# Altium footprint library LUMI_Handy_Soldering_LIB.PcbLib: 562 footprints (part 21 of 36)
Each footprint in its own frame and in the unit in brackets; x right, y up, seen from the top. Pads: shape width x height; smd on the part's side, far side on the other; paste and mask are expansions set on the pad; w line width, h text height; cw(c..) or ccw(c..) is an arc to the next point about the centre after c.
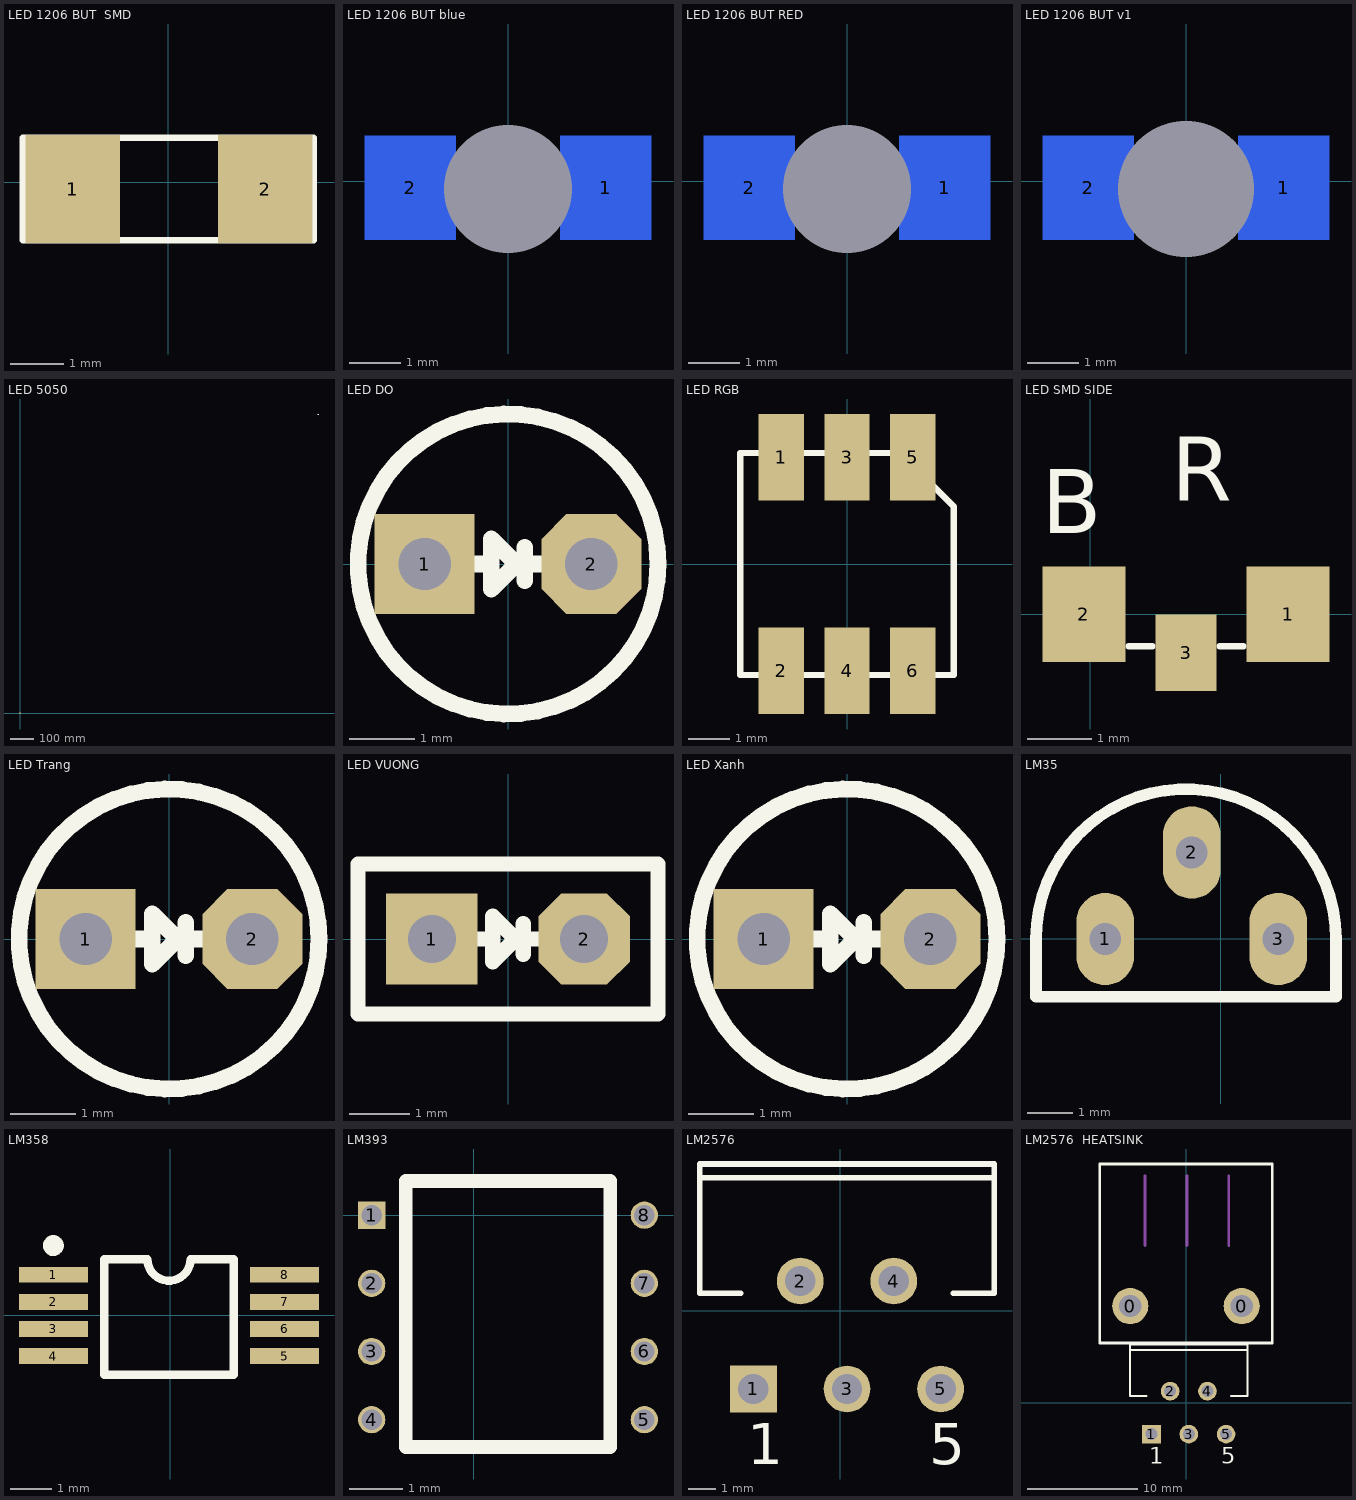
[diagram p20: the footprints below, top view; thin cyan lines are the x and y axes]

## LED 1206 BUT  SMD [mil]
pads (2):
  rect 70x80 smd: 1(-71,-5) 2(72,-5)
Top Overlay:
  lines w5: -108,-43 108,-43 108,33 -108,33 -108,-43
3D body: height 43.81, standoff -15.9, extent -60,-37 66,26

## LED 1206 BUT blue [mil]
pads (3):
  rect 70x80 smd far side: 1(75,-5) 2(-75,-5)
  round 0 hole 98.43: ""(0,-6)
Bottom Overlay:
  lines w5: -110,-43 110,-43 110,33 -110,33 -110,-43
3D body: height 6.31, standoff -37, extent -63.39,-37.5 63.39,25.5

## LED 1206 BUT RED [mil]
pads (3):
  rect 70x80 smd far side: 1(75,-5) 2(-75,-5)
  round 0 hole 98.43: ""(0,-6)
Bottom Overlay:
  lines w5: -110,-43 -110,33 110,33 110,-43 -110,-43
3D body: height 6.31, standoff -37, extent -63.39,-37.5 63.39,25.5

## LED 1206 BUT v1 [mil]
pads (3):
  rect 70x80 smd far side: 1(75,-5) 2(-75,-5)
  round 98.43 hole 104.33: ""(0,-6)
Bottom Overlay:
  lines w5: -110,-43 110,-43 110,33 -110,33 -110,-43
3D body: height 8.81, standoff -50.9, extent -63,-37 63,26

## LED 5050 [mm]
pads (8):
  rect 2.5x1 smd: 1(-2.286,1.27) 2(-2.286,-0.254) 3(-2.286,-1.778) 4(2.55,-1.782) 5(2.55,-0.258) 6(2.55,1.266)
  rect 1.778x2.032 smd: 1(1264.197,1269.873) 2(1267.829,1269.873)
Top Overlay:
  lines w0.127: 1263.257,1268.908 1268.743,1268.908 1268.743,1270.838 1263.257,1270.838 1263.257,1268.908
3D body: height 1.6, standoff 0, extent -2.55,-2.75 2.75,2.25
3D body: height 1.11, standoff -0.4, extent 1264.476,1269.06 1267.676,1270.66

## LED DO [mil]
pads (2):
  rect 60x60 hole 31.5: 1(-50,0)
  oct 60x60 hole 31.5: 2(50,0)
Top Overlay:
  circle w10: c0,0 r90
  lines w10: -20,0 -10,0 ; 10,-10 10,10 ; 10,0 20,0 ; -10,-15 -10,15 5,0 -10,-15
3D body: height 212, standoff -125, extent -78.42,-58.99 78.43,78.51

## LED RGB [mm] "Typical GAs Led, through hole, pitch 100mil"
pads (6):
  rect 1.1x2.1 smd: 1(-1.6,2.6) 2(-1.6,-2.6) 3(0,2.6) 4(0,-2.6) 5(1.6,2.6) 6(1.6,-2.6)
Top Overlay:
  lines w0.152: -2.6,-2.7 -2.6,2.7 1.3,2.7 2.6,1.4 2.6,-2.7 -2.6,-2.7
3D body: height 1.5, standoff -0.1, extent -2.5,-2.6 2.5,2.6

## LED SMD SIDE [mm]
pads (3):
  rect 1.3x1.5 smd: 1(3.1,0) 2(-0.1,0)
  rect 0.95x1.2 smd: 3(1.5,-0.6)
Top Overlay:
  lines w0.1: 0.6,-0.5 0.975,-0.5 ; 2.025,-0.5 2.4,-0.5
  text "B" at -0.762,1.27 h1
  text "R" at 1.27,1.778 h1
3D body: height 1, standoff 0, extent 0,-0.45 3,1.55

## LED Trang [mil]
pads (2):
  rect 60x60 hole 31.5: 1(-50,0)
  oct 60x60 hole 31.5: 2(50,0)
Top Overlay:
  circle w10: c0,0 r90
  lines w10: -20,0 -10,0 ; 10,-10 10,10 ; 10,0 20,0 ; -10,-15 -10,15 5,0 -10,-15
3D body: height 255.91, standoff -78.74, extent -74.8,-74.8 63,74.8

## LED VUONG [mil]
pads (2):
  rect 60x60 hole 31.5: 1(-50,0)
  oct 60x60 hole 31.5: 2(50,0)
Top Overlay:
  lines w10: -20,0 -10,0 ; 10,-10 10,10 ; 10,0 20,0 ; -98.43,-49.21 -98.43,49.21 98.43,49.21 98.43,-49.21 -98.43,-49.21 ; -10,-15 -10,15 5,0 -10,-15

## LED Xanh [mil]
pads (2):
  rect 60x60 hole 31.5: 1(-50,0)
  oct 60x60 hole 31.5: 2(50,0)
Top Overlay:
  circle w10: c0,0 r90
  lines w10: -20,0 -10,0 ; 10,-10 10,10 ; 10,0 20,0 ; -10,-15 5,0 -10,15 -10,-15
3D body: height 262, standoff -75, extent -77.42,-58.99 79.43,78.51

## LM35 [mm]
pads (3):
  oval 1.27x2.032 hole 0.7: 1(-2.54,0) 2(-0.635,1.905) 3(1.27,0)
Top Overlay:
  lines w0.254: -4.064,-1.27 -4.064,0 cw(c-0.762,0) 2.54,0 2.54,-1.27 -4.064,-1.27
3D body: height 6.99, standoff -0.71, extent -3.39,-1.1 2.19,2.871

## LM358 [mm]
pads (8):
  rect 1.65x0.38 smd: 1(-2.8,0.975) 2(-2.8,0.325) 3(-2.8,-0.325) 4(-2.8,-0.975) 5(2.75,-0.975) 6(2.75,-0.325) 7(2.75,0.325) 8(2.75,0.975)
Top Overlay:
  circle w0.25: c-2.8,1.675 r0.125
  lines w0.2: -1.575,-1.425 -1.575,1.35 -0.542,1.35 ccw(c-0.025,1.35) 0.492,1.35 1.525,1.35 1.525,-1.425 -1.575,-1.425

## LM393 [mil] "DIP; 8 Leads; Row Spacing 7.62 mm; Pitch 2.54 mm"
height 200
pads (8):
  rect 20x20 hole 15: 1(-75,0)
  round 20 hole 15: 2(-75,-50) 3(-75,-100) 4(-75,-150) 5(125,-150) 6(125,-100) 7(125,-50) 8(125,0)
Top Overlay:
  lines w10: -50,-170 -50,-150 -50,25 ; -50,-170 -50,25 ; -50,-170 100,-170 100,25 -50,25

## LM2576 [mm]
pads (5):
  rect 1.7x1.7 hole 1.1: 1(-3.146,-2.849)
  round 1.7 hole 1.1: 2(-1.446,1.071) 3(0.254,-2.849) 4(1.954,1.071) 5(3.654,-2.849)
Top Overlay:
  lines w0.2: -5.096,4.821 5.604,4.821 ; -3.6,0.621 -5.096,0.621 -5.096,5.321 5.604,5.321 5.604,0.621 4.108,0.621
  text "1" at -3.366,-5.574 h1.5
  text "5" at 3.234,-5.574 h1.5
3D body: height 21.59, standoff -2.4, extent -4.826,-3.048 5.334,5.192

## LM2576  HEATSINK [mm]
pads (7):
  round 3.302 hole 2.032: 0(-5.08,8.826) 0(5.08,8.826)
  rect 1.7x1.7 hole 1.1: 1(-3.146,-2.849)
  round 1.7 hole 1.1: 2(-1.446,1.071) 3(0.254,-2.849) 4(1.954,1.071) 5(3.654,-2.849)
Top Overlay:
  lines w0.2: -5.27,5.46 5.43,5.46 ; -5.096,4.821 5.604,4.821 ; -3.6,0.621 -5.096,0.621 -5.096,5.321 5.604,5.321 5.604,0.621 4.108,0.621
  lines w0.254: -7.874,5.46 -7.874,21.78 -7.54,21.78 7.874,21.78 7.874,5.46 -7.874,5.46
  text "1" at -3.366,-5.574 h1.5
  text "5" at 3.234,-5.574 h1.5
Mechanical 1:
  lines w0.254: -3.73,14.35 -3.73,20.7 ; 0.08,14.35 0.08,20.7 ; 3.89,14.35 3.89,20.7
3D body: height 21.59, standoff -2.4, extent -4.826,-3.048 5.334,5.192
3D body: height 5, standoff -5, extent 4.336,8.078 5.83,9.575
3D body: height 5, standoff -5, extent -5.824,8.078 -4.33,9.575
3D body: height 22.86, standoff 0.76, extent -7.62,5.27 7.62,21.78